# Altium footprint library CUSTOM PCB.PcbLib: 404 footprints (part 5 of 26)
Each footprint in its own frame and in the unit in brackets; x right, y up, seen from the top. Pads: shape width x height; smd on the part's side, far side on the other; paste and mask are expansions set on the pad; w line width, h text height; cw(c..) or ccw(c..) is an arc to the next point about the centre after c.
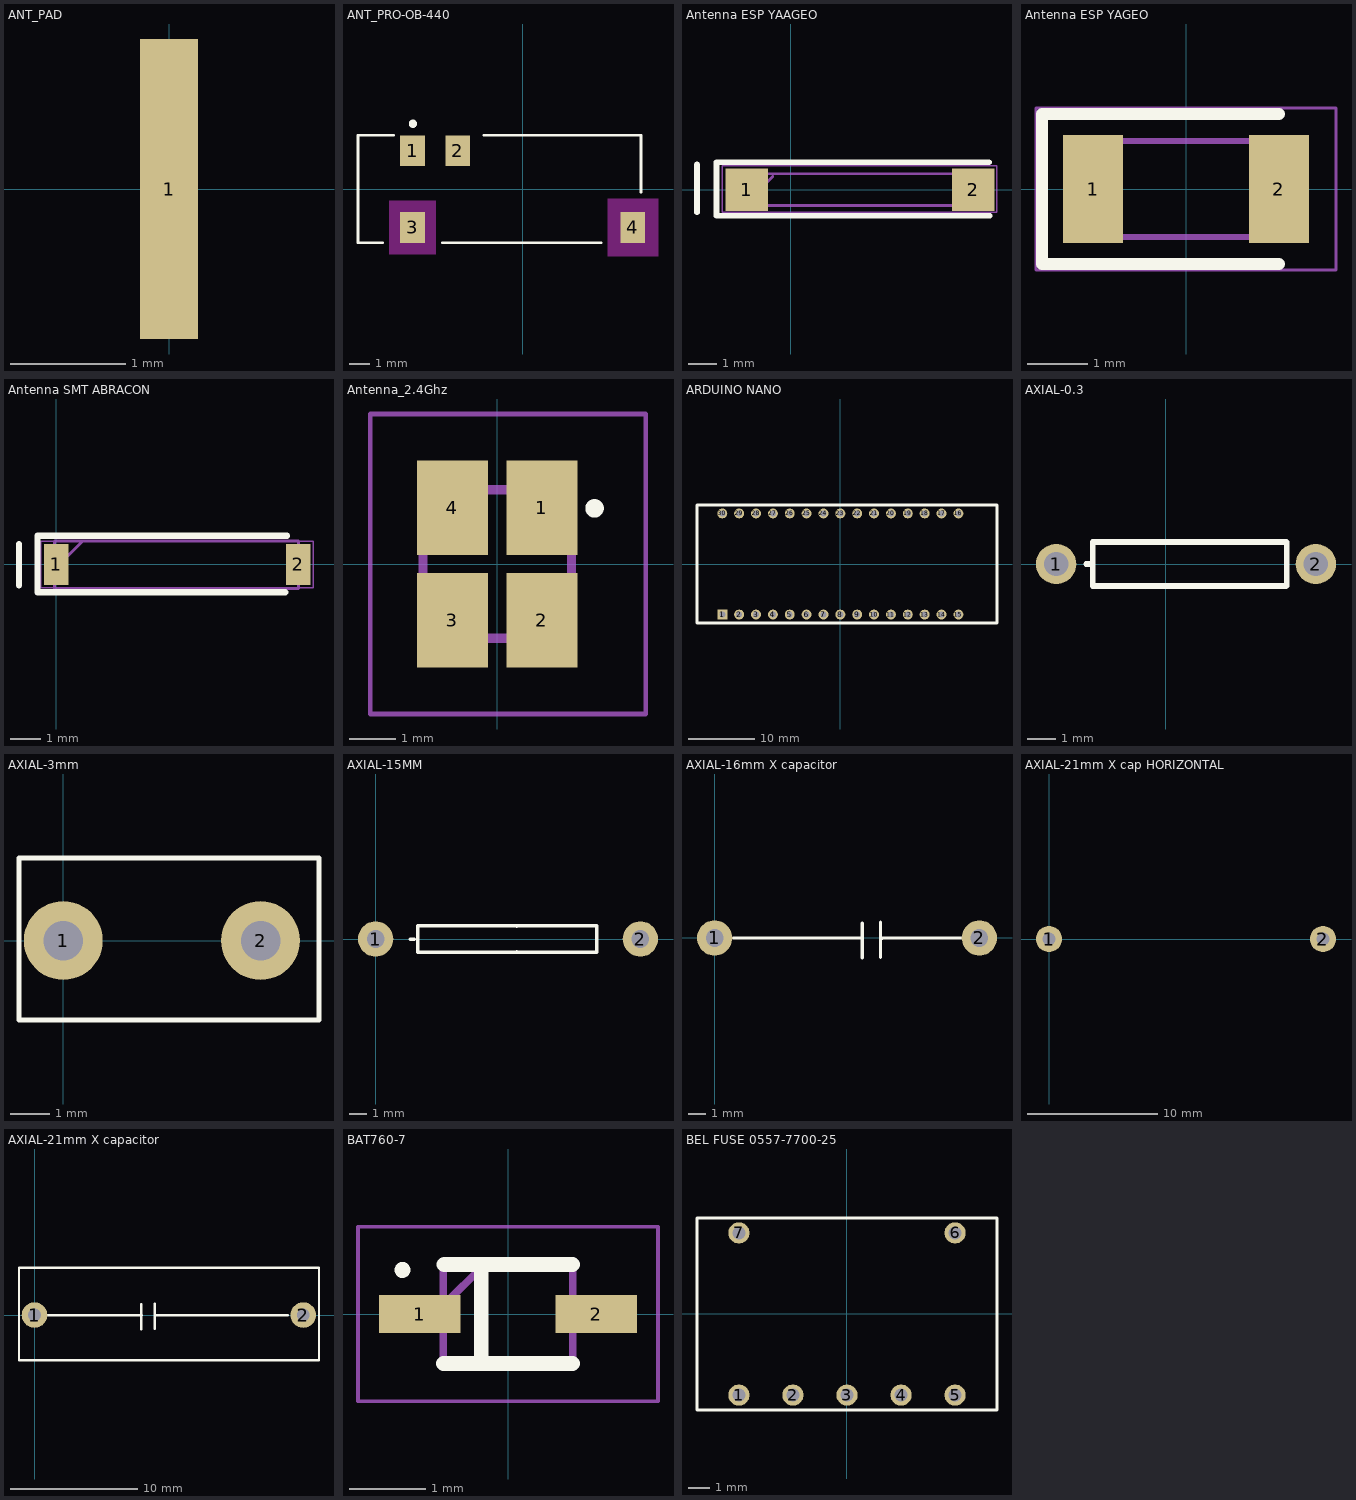
[diagram p4: the footprints below, top view; thin cyan lines are the x and y axes]

## ANT_PAD [mm]
pads (1):
  rect 0.5x2.6 smd: 1(0,0)

## ANT_PRO-OB-440 [mm]
pads (4):
  rect 1.2x1.5 smd: 1(-5.35,1.865) 2(-3.15,1.865) 3(-5.35,-1.865) 4(5.35,-1.865)
Top Overlay:
  circle w0.2: c-5.334,3.175 r0.1
  lines w0.127: -6.795,-2.615 -8,-2.615 -8,2.615 -6.27,2.615 ; -3.905,-2.615 3.805,-2.615 ; -1.9,2.615 5.75,2.615 5.75,-0.145
Keep-Out Layer:
  region: -4.225,-3.165 -6.475,-3.165 -6.475,-0.565 -4.225,-0.565
  region: -4.225,-3.165 -6.475,-3.165 -6.475,-0.565 -4.225,-0.565
  region: -4.225,-3.165 -6.475,-3.165 -6.475,-0.565 -4.225,-0.565
  region: 6.575,-3.265 4.125,-3.265 4.125,-0.465 6.575,-0.465
  region: 6.575,-3.265 4.125,-3.265 4.125,-0.465 6.575,-0.465
  region: 6.575,-3.265 4.125,-3.265 4.125,-0.465 6.575,-0.465
3D body "PRO-OB-440--3DModel-STEP-56544": height 3.56, standoff 0.03, extent -8.018,-2.615 5.732,2.615

## Antenna ESP YAAGEO [mm] "ANT8010LL04R2400A"
pads (2):
  rect 1.5x1.5 smd: 1(-1.55,0) 2(6.401,0)
Top Overlay:
  lines w0.2: -3.302,-0.787 -3.302,0.889 ; 6.96,0.965 -2.616,0.965 -2.616,-0.914 6.985,-0.914
Mechanical 15:
  lines w0.1: -1.143,-0.03 -0.643,0.47 ; -1.6,-0.559 6.401,-0.559 6.401,0.559 -1.6,0.559 -1.6,-0.559
Mechanical 20:
  lines w0.05: -2.413,-0.787 7.239,-0.787 7.239,0.838 -2.413,0.838 -2.413,-0.787
3D body: height 1, standoff 0, extent -1.575,-0.787 6.426,0.813

## Antenna ESP YAGEO [mm] "ANT3216LL00R2400A"
pads (2):
  rect 1x1.8 smd: 1(-1.55,0) 2(1.55,0)
Top Overlay:
  lines w0.2: 1.55,-1.25 -2.4,-1.25 -2.4,1.25 1.55,1.25
Mechanical 15:
  lines w0.1: -1.6,0.3 -1.1,0.8 ; -1.6,-0.8 1.6,-0.8 1.6,0.8 -1.6,0.8 -1.6,-0.8
Mechanical 20:
  lines w0.05: -2.5,-1.35 2.5,-1.35 2.5,1.35 -2.5,1.35 -2.5,-1.35
3D body "ANT3216LL00R2400A.stp": height 1.35, standoff 0, extent -1.6,-0.8 1.6,0.8

## Antenna SMT ABRACON [mm] "ACAG0801-2450-T"
pads (2):
  rect 0.8x1.35 smd: 1(-0.001,0) 2(7.95,0)
Top Overlay:
  lines w0.2: -1.219,-0.686 -1.219,0.66 ; 7.518,-0.914 -0.61,-0.914 -0.61,0.94 7.569,0.94
Mechanical 15:
  lines w0.1: 0.338,0.237 0.838,0.737 ; -0.051,-0.787 -0.051,0.762 7.95,0.762 7.95,-0.787 -0.051,-0.787
Mechanical 20:
  lines w0.05: -0.508,-0.762 -0.508,0.762 8.433,0.762 8.433,-0.762 -0.508,-0.762
3D body: height 1, standoff 0, extent -0.051,-0.762 7.976,0.737

## Antenna_2.4Ghz [mm]
pads (4):
  rect 1.54x2.04 smd: 1(0.965,1.215) 2(0.965,-1.215) 3(-0.965,-1.215) 4(-0.965,1.215)
Top Overlay:
  lines w0.2: 2.1,1.1 cw(c2.1,1.2) 2.1,1.3 cw(c2.1,1.2) 2.1,1.1
Mechanical 15:
  lines w0.2: -1.6,-1.6 -1.6,1.6 1.6,1.6 1.6,-1.6 -1.6,-1.6
Mechanical 20:
  lines w0.1: -2.735,-3.235 -2.735,3.235 3.2,3.235 3.2,-3.235 -2.735,-3.235
3D body "479480001.stp": height 3.95, standoff -0.05, extent -1.57,-1.697 1.57,1.443

## ARDUINO NANO [mm] "Connector; Header; 15x2 Position"
pads (30):
  rect 1.5x1.5 hole 0.9: 1(-17.78,-7.62)
  round 1.5 hole 0.9: 2(-15.24,-7.62) 3(-12.7,-7.62) 4(-10.16,-7.62) 5(-7.62,-7.62) 6(-5.08,-7.62) 7(-2.54,-7.62) 8(0,-7.62) 9(2.54,-7.62) 10(5.08,-7.62) 11(7.62,-7.62) 12(10.16,-7.62) 13(12.7,-7.62) 14(15.24,-7.62) 15(17.78,-7.62) 16(17.78,7.62) 17(15.24,7.62) 18(12.7,7.62) 19(10.16,7.62) 20(7.62,7.62) 21(5.08,7.62) 22(2.54,7.62) 23(0,7.62) 24(-2.54,7.62) 25(-5.08,7.62) 26(-7.62,7.62) 27(-10.16,7.62) 28(-12.7,7.62) 29(-15.24,7.62) 30(-17.78,7.62)
Top Overlay:
  lines w0.4: -21.59,8.865 -21.59,-8.89 ; -19.05,-8.89 19.05,-8.89 ; -21.59,-8.89 -21.59,8.89 -19.05,8.89 19.05,8.89 23.597,8.89 23.597,-6.765 23.597,-8.89 21.59,-8.89 -21.59,-8.89
3D body "arduino nano.STEP": height 12.6, standoff -6, extent -21.62,-8.983 23.38,9.017

## AXIAL-0.3 [mm] "Axial Device, Thru-Hole; 2 Leads; 0.3 in Pin Spacing"
height 1.524
pads (2):
  round 1.4 hole 0.85: 1(-3.81,0) 2(5.2,0)
Top Overlay:
  lines w0.1: 3.598,-0.762 ccw(c3.598,-0.759) 3.601,-0.759
  lines w0.2: -2.769,0 -2.54,0 ; 3.598,-0.762 2.54,-0.762 -2.54,-0.762 -2.54,0.762 3.302,0.762 4.166,0.762 cw(c4.166,0.737) 4.191,0.737 4.191,-0.737 cw(c4.169,-0.737) 4.169,-0.759 3.601,-0.759
3D body "Actual resistor.stp": height 2.24, standoff -1.51, extent -4.103,-1.014 5.565,1.056

## AXIAL-3mm [mm] "Axial Device, Thru-Hole; 2 Leads; 0.3 in Pin Spacing"
height 1.524
pads (2):
  round 2 hole 1: 1(0,0) 2(5,0)
Top Overlay:
  lines w0.127: -1.123,-2.014 6.482,-2.014 6.482,2.093 -1.123,2.093 -1.123,-2.014
3D body "User Library-Resistor KNP-100.step": height 15.4, standoff -4, extent 0.072,-1.981 6.482,2.039

## AXIAL-15MM [mm] "Axial Device, Thru-Hole; 2 Leads; 0.3 in Pin Spacing"
height 1.524
pads (2):
  round 2 hole 1: 1(0,0) 2(15,0)
Top Overlay:
  lines w0.1: 7.408,-0.762 ccw(c7.408,-0.759) 7.411,-0.759
  lines w0.2: 1.956,-0.019 2.185,-0.019 ; 7.408,-0.762 6.35,-0.762 2.375,-0.762 2.375,0.762 7.112,0.762 12.519,0.762 12.519,-0.759 7.411,-0.759 ; 7.976,0.762 cw(c7.976,0.737) 8.001,0.737 ; 7.979,-0.759 ccw(c7.979,-0.737) 8.001,-0.737
3D body "RES1W_OR_2WS_MODEL.STEP": height 4.16, standoff -7.84, extent -0.502,-2.057 15.538,1.943

## AXIAL-16mm X capacitor [mm] "Axial Device, Thru-Hole; 2 Leads; 0.3 in Pin Spacing"
height 1.524
pads (2):
  round 2 hole 1: 1(0,0) 2(15,0)
Top Overlay:
  lines w0.19: 1.041,0 8.382,0 ; 8.357,-1.118 8.357,0.838 ; 9.398,-1.092 9.398,0.889 ; 9.5,-0.025 9.5,0.002 13.767,0.002 14.046,0.002
3D body: height 20, standoff 0, extent 0,-3.505 14.986,3.505

## AXIAL-21mm X cap HORIZONTAL [mm] "Axial Device, Thru-Hole; 2 Leads;"
height 1.524
pads (2):
  round 2 hole 1: 1(0,0) 2(21,0)

## AXIAL-21mm X capacitor [mm] "Axial Device, Thru-Hole; 2 Leads;"
height 1.524
pads (2):
  round 2 hole 1: 1(0,0) 2(21,0)
Top Overlay:
  lines w0.19: 1.041,0 8.382,0 ; 8.357,-1.118 8.357,0.838 ; 9.398,-1.092 9.398,0.889 ; 9.5,-0.025 9.5,0.002 13.767,0.002 14.046,0.002 19.778,0.002 ; -1.212,-3.526 -1.212,3.691 22.23,3.691 22.23,-3.526 -1.212,-3.526
3D body: height 20, standoff 0, extent 0,-3.505 21,3.505

## BAT760-7 [mm]
pads (2):
  rect 1.075x0.5 smd: 1(-1.162,0) 2(1.162,0)
Top Overlay:
  circle w0.127: c-1.39,0.58 r0.041
  lines w0.19: -0.35,-0.65 -0.35,0.65
  lines w0.2: -0.85,-0.65 0.85,-0.65 ; -0.84,0.65 0.85,0.65
Mechanical 15:
  lines w0.1: -0.85,0.112 -0.312,0.65 ; -0.85,-0.65 0.85,-0.65 0.85,0.65 -0.85,0.65 -0.85,-0.65
Mechanical 20:
  lines w0.05: -1.975,-1.15 1.975,-1.15 1.975,1.15 -1.975,1.15 -1.975,-1.15
3D body "BAT760-7.stp": height 1.2, standoff 0, extent -1.21,-0.66 1.29,0.64

## BAT_STP [mm]
3D body: height 12.8, standoff 3.3, extent -33,-26 33,26

## BEL FUSE 0557-7700-25 [mm]
pads (7):
  round 1 hole 0.6: 1(-5.08,-3.81) 2(-2.54,-3.81) 3(0,-3.81) 4(2.54,-3.81) 5(5.08,-3.81) 6(5.08,3.81) 7(-5.08,3.81)
Top Overlay:
  lines w0.152: -7.05,-4.51 -7.05,0 -7.05,4.51 7.05,4.51 7.05,-4.51 -7.05,-4.51